# Altium footprint library PcbLib.PcbLib: 68 footprints (part 4 of 5)
Each footprint in its own frame and in the unit in brackets; x right, y up, seen from the top. Pads: shape width x height; smd on the part's side, far side on the other; paste and mask are expansions set on the pad; w line width, h text height; cw(c..) or ccw(c..) is an arc to the next point about the centre after c.
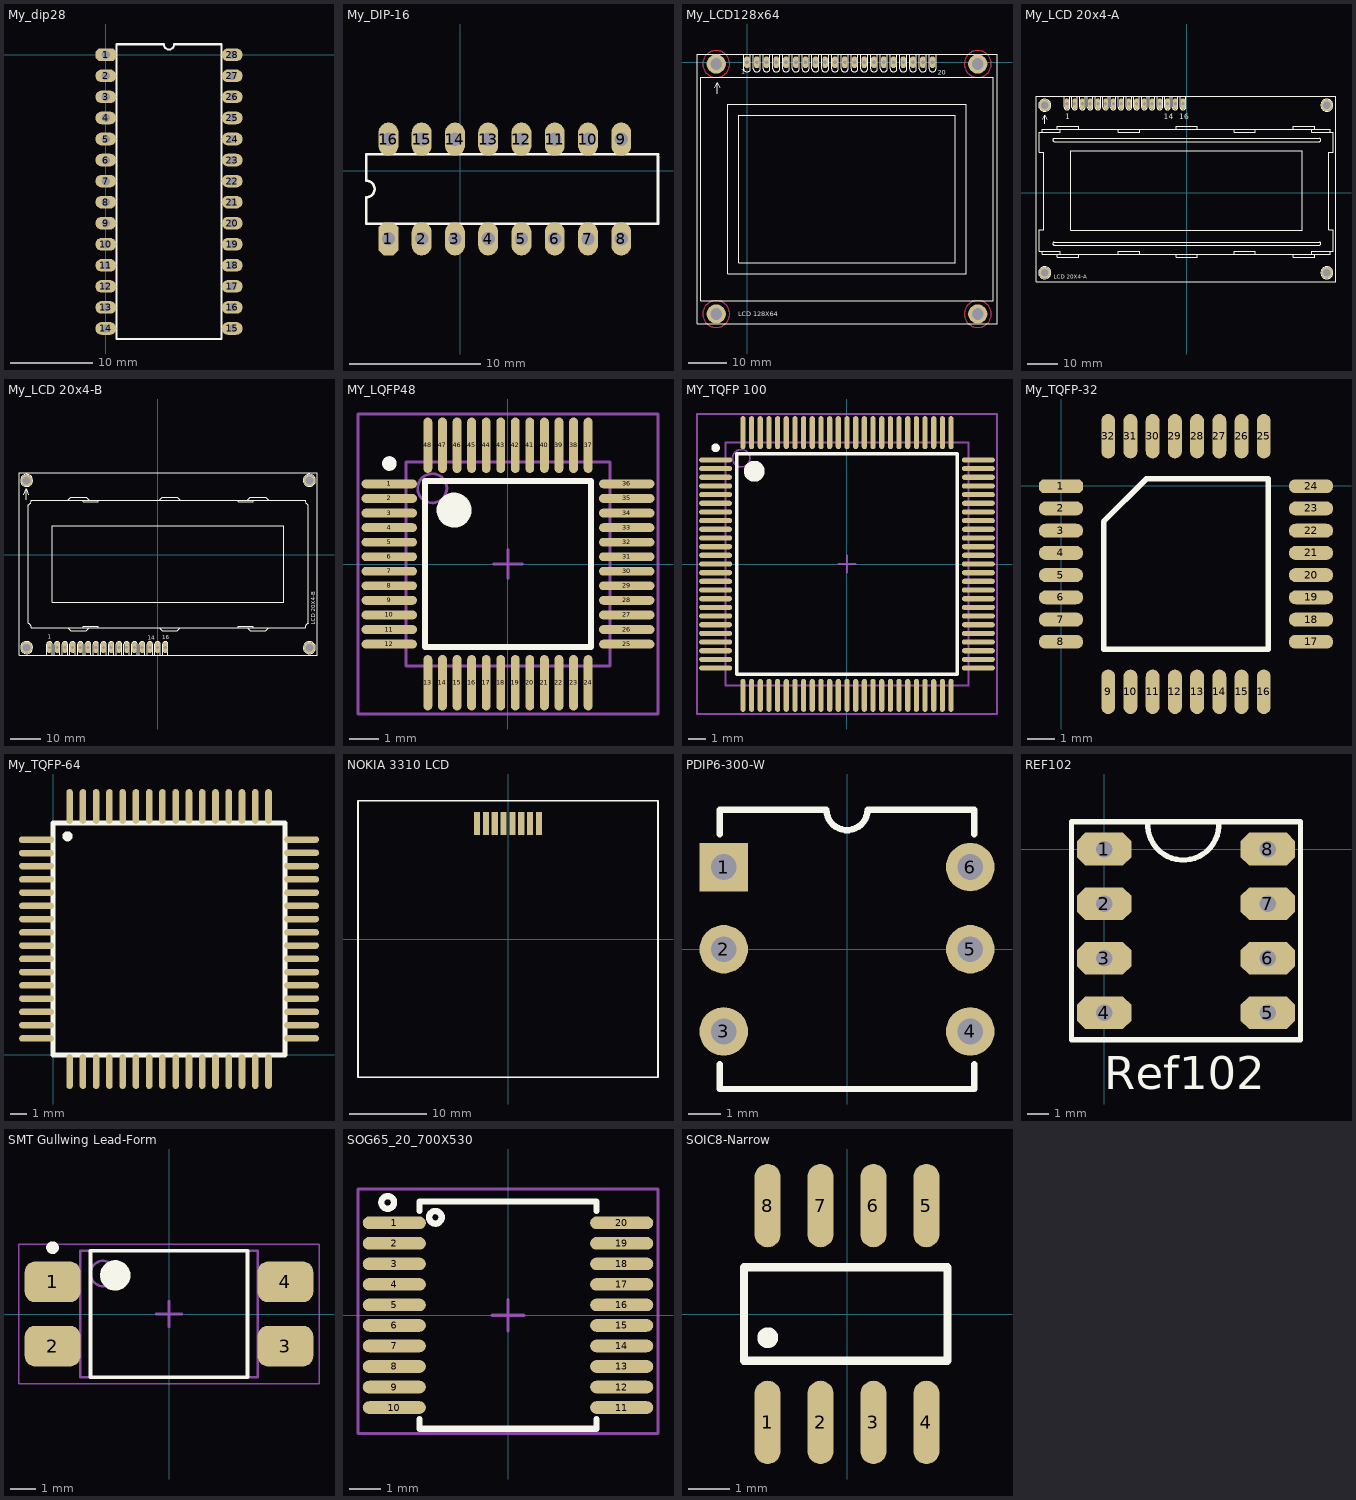
[diagram p3: the footprints below, top view; thin cyan lines are the x and y axes]

## My_dip28 [mil]
pads (28):
  oct 100x60 hole 40: 1(-0.5,-0.5)
  oval 100x60 hole 40: 2(-0.5,-100.5) 3(-0.5,-200.5) 4(-0.5,-300.5) 5(-0.5,-400.5) 6(-0.5,-500.5) 7(-0.5,-600.5) 8(-0.5,-700.5) 9(-0.5,-800.5) 10(-0.5,-900.5) 11(-0.5,-1000.5) 12(-0.5,-1100.5) 13(-0.5,-1200.5) 14(-0.5,-1300.5) 15(599.5,-1300.5) 16(599.5,-1200.5) 17(599.5,-1100.5) 18(599.5,-1000.5) 19(599.5,-900.5) 20(599.5,-800.5) 21(599.5,-700.5) 22(599.5,-600.5) 23(599.5,-500.5) 24(599.5,-400.5) 25(599.5,-300.5) 26(599.5,-200.5) 27(599.5,-100.5) 28(599.5,-0.5)
Top Overlay:
  lines w10: 49.5,-1350.5 49.5,49.5 274.5,49.5 ccw(c299.5,49.5) 324.5,49.5 549.5,49.5 549.5,-1350.5 49.5,-1350.5

## My_DIP-16 [mil]
height 20
pads (16):
  oct 60x100 hole 40: 1(-215.5,-205.5)
  oval 60x100 hole 40: 2(-115.5,-205.5) 3(-15.5,-205.5) 4(84.5,-205.5) 5(184.5,-205.5) 6(284.5,-205.5) 7(384.5,-205.5) 8(484.5,-205.5) 9(484.5,94.5) 10(384.5,94.5) 11(284.5,94.5) 12(184.5,94.5) 13(84.5,94.5) 14(-15.5,94.5) 15(-115.5,94.5) 16(-215.5,94.5)
Top Overlay:
  lines w7.87: -282.04,-160 595,-160 595,43.83 ; -282.04,-159.83 -282.04,-80.5 ccw(c-282.04,-55.5) -282.04,-30.5 -282.04,48.83 595,48.83

## My_LCD128x64 [mm]
pads (24):
  oct 1.508x3.016 hole 1: 1(0,0) 2(2.54,0) 3(5.08,0) 4(7.62,0) 5(10.16,0) 6(12.7,0) 7(15.24,0) 8(17.78,0) 9(20.32,0) 10(22.86,0) 11(25.4,0) 12(27.94,0) 13(30.48,0) 14(33.02,0) 15(35.56,0) 16(38.1,0) 17(40.64,0) 18(43.18,0) 19(45.72,0) 20(48.26,0)
  round 5 hole 3 unplated: ""(-8,-65.46) ""(-8,-0.46) ""(60,-65.46) ""(60,-0.46)
Top Layer:
  circle w0.203: c60,-65.46 r3.502
  circle w0.203: c-8,-65.46 r3.5
  circle w0.203: c60,-0.46 r3.5
  circle w0.203: c-8,-0.46 r3.502
Bottom Layer:
  circle w0.203: c-8,-65.46 r3.505
  circle w0.203: c60,-65.46 r3.502
  circle w0.203: c60,-0.46 r3.502
  circle w0.203: c-8,-0.46 r3.501
Top Overlay:
  lines w0.127: -8.382,-6.604 -7.747,-5.334 -7.112,-6.604 ; -7.747,-8.146 -7.747,-5.461 ; -0.889,1.905 -0.889,-1.651 ccw(c0,-1.651) 0.889,-1.651 0.889,1.905 ; 1.651,1.905 1.651,-1.651 ccw(c2.54,-1.651) 3.429,-1.651 3.429,1.905 ; 4.191,1.905 4.191,-1.651 ccw(c5.08,-1.651) 5.969,-1.651 5.969,1.905 ; 6.731,1.905 6.731,-1.651 ccw(c7.62,-1.651) 8.509,-1.651 8.509,1.905 ; 9.271,1.905 9.271,-1.651 ccw(c10.16,-1.651) 11.049,-1.651 11.049,1.905 ; 11.811,1.905 11.811,-1.651 ccw(c12.7,-1.651) 13.589,-1.651 13.589,1.905 ; 14.351,1.905 14.351,-1.651 ccw(c15.24,-1.651) 16.129,-1.651 16.129,1.905 ; 16.891,1.905 16.891,-1.651 ccw(c17.78,-1.651) 18.669,-1.651 18.669,1.905 ; 19.431,1.905 19.431,-1.651 ccw(c20.32,-1.651) 21.209,-1.651 21.209,1.905 ; 21.971,1.905 21.971,-1.651 ccw(c22.86,-1.651) 23.749,-1.651 23.749,1.905 ; 24.511,1.905 24.511,-1.651 ccw(c25.4,-1.651) 26.289,-1.651 26.289,1.905 ; 27.051,1.905 27.051,-1.651 ccw(c27.94,-1.651) 28.829,-1.651 28.829,1.905 ; 29.591,1.905 29.591,-1.651 ccw(c30.48,-1.651) 31.369,-1.651 31.369,1.905 ; 32.131,1.905 32.131,-1.651 ccw(c33.02,-1.651) 33.909,-1.651 33.909,1.905 ; 34.671,1.905 34.671,-1.651 ccw(c35.56,-1.651) 36.449,-1.651 36.449,1.905 ; 37.211,1.905 37.211,-1.651 ccw(c38.1,-1.651) 38.989,-1.651 38.989,1.905 ; 39.751,1.905 39.751,-1.651 ccw(c40.64,-1.651) 41.529,-1.651 41.529,1.905 ; 42.291,1.905 42.291,-1.651 ccw(c43.18,-1.651) 44.069,-1.651 44.069,1.905 ; 44.831,1.905 44.831,-1.651 ccw(c45.72,-1.651) 46.609,-1.651 46.609,1.905 ; 47.371,1.905 47.371,-1.651 ccw(c48.26,-1.651) 49.149,-1.651 49.149,1.905
  lines w0.203: -13,-67.96 65,-67.96 65,2.04 -13,2.04 -13,-67.96 ; -12,-61.96 64,-61.96 64,-3.96 -12,-3.96 -12,-61.96 ; -5,-54.96 57,-54.96 57,-10.96 -5,-10.96 -5,-54.96 ; -2.13,-52.14 54.14,-52.14 54.14,-13.79 -2.13,-13.79 -2.13,-52.14
  text "LCD 128X64" at -2.286,-66.04 h1.27
  text "1" at -1.524,-3.048 h1.27
  text "20" at 49.53,-3.302 h1.27

## My_LCD 20x4-A [mil]
pads (20):
  oct 60x140 hole 40: 1(-1550.5,1150) 2(-1450.5,1150) 3(-1350.5,1150) 4(-1250.5,1150) 5(-1150.5,1150) 6(-1050.5,1150) 7(-950.5,1150) 8(-850.5,1150) 9(-750.5,1150) 10(-650.5,1150) 11(-550.5,1150) 12(-450.5,1150) 13(-350.5,1150) 14(-250.5,1150) 15(-150.5,1150) 16(-50.5,1150)
  round 150 hole 100: P$1(-1837.5,-1035) P$2(1808.5,-1035) P$3(1808.5,1130.5) P$4(-1837.5,1130)
Top Overlay:
  drawing of 163 lines, arcs and shapes, not listed
  text "1" at -1575,950 h70
  text "16" at -100,950 h70
  text "14" at -300,950 h70
  text "LCD 20X4-A" at -1719.69,-1112.2 h50

## My_LCD 20x4-B [mil]
pads (20):
  oct 60x140 hole 40: 1(-1400.5,-1199) 2(-1300.5,-1199) 3(-1200.5,-1199) 4(-1100.5,-1199) 5(-1000.5,-1199) 6(-900.5,-1199) 7(-800.5,-1199) 8(-700.5,-1199) 9(-600.5,-1199) 10(-500.5,-1199) 11(-400.5,-1199) 12(-300.5,-1199) 13(-200.5,-1199) 14(-100.5,-1199) 15(-0.5,-1199) 16(99.5,-1199)
  round 150 hole 100: P$1(-1695.5,965.5) P$2(-1695.5,-1199.5) P$3(1966,-1200) P$4(1966,965.5)
Top Overlay:
  circle w5: c-1695.5,965.5 r78
  circle w5: c1966,965.5 r78
  circle w5: c1966,-1199.5 r78
  circle w5: c-1695.5,-1199.5 r78
  lines w5: -1734.95,-1199.6 -1656.21,-1199.6 ; -1734.95,965.8 -1656.21,965.8 ; -1730,778.7 -1700,859 -1675,778.7 ; -1700,716.5 -1700,844 ; -1695.58,-1239 -1695.58,-1160.2 ; -1695.58,926.4 -1695.58,1005.1 ; -1673.23,-885.9 -1673.23,649.6 ; -1673.23,-885.83 cw(c-1692.91,-941.6) -1633.86,-944.88 -1161.42,-944.9 ; -1673.23,649.53 ccw(c-1692.91,705.3) -1633.86,708.58 -1161.42,708.6 ; -1435,-1295 -1435,-1155 cw(c-1400,-1157.5) -1365,-1160 -1365,-1295 ; -1335,-1295 -1335,-1155 cw(c-1300,-1157.5) -1265,-1160 -1265,-1295 ; -1235,-1295 -1235,-1155 cw(c-1200,-1157.5) -1165,-1160 -1165,-1295 ; -1135,-1295 -1135,-1155 cw(c-1100,-1157.5) -1065,-1160 -1065,-1295 ; -1035,-1295 -1035,-1155 cw(c-1000,-1157.5) -965,-1160 -965,-1295 ; -935,-1295 -935,-1155 cw(c-900,-1157.5) -865,-1160 -865,-1295 ; -835,-1295 -835,-1155 cw(c-800,-1157.5) -765,-1160 -765,-1295 ; -735,-1295 -735,-1155 cw(c-700,-1157.5) -665,-1160 -665,-1295 ; -635,-1295 -635,-1155 cw(c-600,-1157.5) -565,-1160 -565,-1295 ; -535,-1295 -535,-1155 cw(c-500,-1157.5) -465,-1160 -465,-1295 ; -435,-1295 -435,-1155 cw(c-400,-1157.5) -365,-1160 -365,-1295 ; -335,-1295 -335,-1155 cw(c-300,-1157.5) -265,-1160 -265,-1295 ; -235,-1295 -235,-1155 cw(c-200,-1157.5) -165,-1160 -165,-1295 ; -135,-1295 -135,-1155 cw(c-100,-1157.5) -65,-1160 -65,-1295 ; -35,-1295 -35,-1155 cw(c0,-1157.5) 35,-1160 35,-1295 ; 65,-1295 65,-1155 cw(c100,-1157.5) 135,-1160 135,-1295 ; 1631.19,316.1 1631.19,375.2 ; 1926.47,-1199.6 2005.21,-1199.6 ; 1926.47,965.8 2005.21,965.8 ; 1948.82,-885.9 1948.82,649.6 ; 1948.82,-885.83 ccw(c1968.5,-941.6) 1909.45,-944.88 1437.01,-944.9 ; 1948.82,649.53 cw(c1968.5,705.3) 1909.45,708.58 1437.01,708.6 ; 1965.84,-1239 1965.84,-1160.2 ; 1965.84,926.4 1965.84,1005.1 ; -1161.42,-944.9 -1122.05,-984.3 -925.2,-984.3 -885.83,-944.9 ; -1161.42,-944.9 -964.57,-944.9 ; -1161.42,708.6 -1122.05,748 -925.2,748 -885.83,708.6 ; -1161.42,708.6 -964.57,708.6 ; -964.57,-944.9 -964.57,-925.2 -767.72,-925.2 -767.72,-944.9 ; -964.57,-944.9 -885.83,-944.9 ; -964.57,708.6 -964.57,688.9 -767.72,688.9 -767.72,708.6 ; -964.57,708.6 -885.83,708.6 ; -885.83,-944.9 -767.72,-944.9 ; -885.83,708.6 -767.72,708.6 ; -767.72,-944.9 19.68,-944.9 ; -767.72,708.6 19.68,708.6 ; 19.68,-944.9 59.05,-984.3 255.9,-984.3 295.27,-944.9 ; 19.68,-944.9 295.27,-944.9 ; 19.68,708.6 59.05,748 255.9,748 295.27,708.6 ; 19.68,708.6 295.27,708.6 ; 295.27,-944.9 1043.31,-944.9 ; 295.27,708.6 1043.31,708.6 ; 1043.31,-944.9 1043.31,-925.2 1240.16,-925.2 1240.16,-944.9 ; 1043.31,-944.9 1161.42,-944.9 ; 1043.31,708.6 1043.31,688.9 1240.16,688.9 1240.16,708.6 ; 1043.31,708.6 1161.42,708.6 ; 1161.42,-944.9 1200.79,-984.3 1397.64,-984.3 1437.01,-944.9 ; 1161.42,-944.9 1240.16,-944.9 ; 1161.42,708.6 1200.79,748 1397.64,748 1437.01,708.6 ; 1161.42,708.6 1240.16,708.6 ; 1240.16,-944.9 1437.01,-944.9 ; 1240.16,708.6 1437.01,708.6 ; 1631.19,375.2 1631.19,-609.1 -1360.93,-609.1 -1360.93,375.2 1631.19,375.2 ; -1794,-1298 -1794,1064.2 2064.27,1064.2 2064.27,-1298 -1794,-1298
  text "LCD 20X4-B" at 2040.16,-903.2 h50
  text "16" at 60,-1094 h50
  text "1" at -1420,-1084 h50
  text "14" at -130,-1100 h50

## MY_LQFP48 [mm] "TSQFP, 48-Leads, Body 9.0x9.0mm (max), Pitch 0.50mm, IPC Medium Density"
height 1.6
pads (48):
  oval 1.905x0.3 smd: 1(-4.075,2.75) 2(-4.075,2.25) 3(-4.075,1.75) 4(-4.075,1.25) 5(-4.075,0.75) 6(-4.075,0.25) 7(-4.075,-0.25) 8(-4.075,-0.75) 9(-4.075,-1.25) 10(-4.075,-1.75) 11(-4.075,-2.25) 12(-4.075,-2.75) 25(4.075,-2.75) 26(4.075,-2.25) 27(4.075,-1.75) 28(4.075,-1.25) 29(4.075,-0.75) 30(4.075,-0.25) 31(4.075,0.25) 32(4.075,0.75) 33(4.075,1.25) 34(4.075,1.75) 35(4.075,2.25) 36(4.075,2.75)
  oval 0.3x1.905 smd: 13(-2.75,-4.075) 14(-2.25,-4.075) 15(-1.75,-4.075) 16(-1.25,-4.075) 17(-0.75,-4.075) 18(-0.25,-4.075) 19(0.25,-4.075) 20(0.75,-4.075) 21(1.25,-4.075) 22(1.75,-4.075) 23(2.25,-4.075) 24(2.75,-4.075) 37(2.75,4.075) 38(2.25,4.075) 39(1.75,4.075) 40(1.25,4.075) 41(0.75,4.075) 42(0.25,4.075) 43(-0.25,4.075) 44(-0.75,4.075) 45(-1.25,4.075) 46(-1.75,4.075) 47(-2.25,4.075) 48(-2.75,4.075)
Top Overlay:
  circle w0.25: c-4.075,3.45 r0.125
  circle w0.6: c-1.85,1.85 r0.3
  lines w0.2: -2.85,-2.85 -2.85,2.85 2.85,2.85 2.85,-2.85 -2.85,-2.85
Mechanical 13:
  circle w0.1: c-2.6,2.6 r0.5
  lines w0.1: -3.5,-3.5 -3.5,3.5 3.5,3.5 3.5,-3.5 -3.5,-3.5
Mechanical 15:
  lines w0.1: -0.5,0 0.5,0 ; 0,-0.5 0,0.5 ; -5.15,-5.15 -5.15,5.15 5.15,5.15 5.15,-5.15 -5.15,-5.15
3D body: height 1.6, standoff 0.05, extent -3.5,-3.5 3.5,3.5

## MY_TQFP 100 [mm] "TSQFP, 100-Leads, Body 16.0x16.0mm (max), Pitch 0.50mm, IPC Medium Density"
height 1.6
pads (100):
  oval 1.905x0.3 smd: 1(-7.575,6) 2(-7.575,5.5) 3(-7.575,5) 4(-7.575,4.5) 5(-7.575,4) 6(-7.575,3.5) 7(-7.575,3) 8(-7.575,2.5) 9(-7.575,2) 10(-7.575,1.5) 11(-7.575,1) 12(-7.575,0.5) 13(-7.575,0) 14(-7.575,-0.5) 15(-7.575,-1) 16(-7.575,-1.5) 17(-7.575,-2) 18(-7.575,-2.5) 19(-7.575,-3) 20(-7.575,-3.5) 21(-7.575,-4) 22(-7.575,-4.5) 23(-7.575,-5) 24(-7.575,-5.5) 25(-7.575,-6) 51(7.575,-6) 52(7.575,-5.5) 53(7.575,-5) 54(7.575,-4.5) 55(7.575,-4) 56(7.575,-3.5) 57(7.575,-3) 58(7.575,-2.5) 59(7.575,-2) 60(7.575,-1.5) 61(7.575,-1) 62(7.575,-0.5) 63(7.575,0) 64(7.575,0.5) 65(7.575,1) 66(7.575,1.5) 67(7.575,2) 68(7.575,2.5) 69(7.575,3) 70(7.575,3.5) 71(7.575,4) 72(7.575,4.5) 73(7.575,5) 74(7.575,5.5) 75(7.575,6)
  oval 0.3x1.905 smd: 26(-6,-7.575) 27(-5.5,-7.575) 28(-5,-7.575) 29(-4.5,-7.575) 30(-4,-7.575) 31(-3.5,-7.575) 32(-3,-7.575) 33(-2.5,-7.575) 34(-2,-7.575) 35(-1.5,-7.575) 36(-1,-7.575) 37(-0.5,-7.575) 38(0,-7.575) 39(0.5,-7.575) 40(1,-7.575) 41(1.5,-7.575) 42(2,-7.575) 43(2.5,-7.575) 44(3,-7.575) 45(3.5,-7.575) 46(4,-7.575) 47(4.5,-7.575) 48(5,-7.575) 49(5.5,-7.575) 50(6,-7.575) 76(6,7.575) 77(5.5,7.575) 78(5,7.575) 79(4.5,7.575) 80(4,7.575) 81(3.5,7.575) 82(3,7.575) 83(2.5,7.575) 84(2,7.575) 85(1.5,7.575) 86(1,7.575) 87(0.5,7.575) 88(0,7.575) 89(-0.5,7.575) 90(-1,7.575) 91(-1.5,7.575) 92(-2,7.575) 93(-2.5,7.575) 94(-3,7.575) 95(-3.5,7.575) 96(-4,7.575) 97(-4.5,7.575) 98(-5,7.575) 99(-5.5,7.575) 100(-6,7.575)
Top Overlay:
  circle w0.25: c-7.575,6.7 r0.125
  circle w0.6: c-5.35,5.35 r0.3
  lines w0.2: -6.35,-6.35 -6.35,6.35 6.35,6.35 6.35,-6.35 -6.35,-6.35
Mechanical 13:
  circle w0.1: c-6.1,6.1 r0.5
  lines w0.1: -7,-7 -7,7 7,7 7,-7 -7,-7
Mechanical 15:
  lines w0.1: -0.5,0 0.5,0 ; 0,-0.5 0,0.5 ; -8.65,-8.65 -8.65,8.65 8.65,8.65 8.65,-8.65 -8.65,-8.65
3D body: height 1.6, standoff 0.05, extent -7,-7 7,7

## My_TQFP-32 [mm]
pads (32):
  oct 1.6x0.5 smd: 1(-0.013,-0.019)
  oval 1.6x0.5 smd: 2(-0.013,-0.819) 3(-0.013,-1.619) 4(-0.013,-2.419) 5(-0.013,-3.219) 6(-0.013,-4.019) 7(-0.013,-4.819) 8(-0.013,-5.619) 17(8.987,-5.619) 18(8.987,-4.819) 19(8.987,-4.019) 20(8.987,-3.219) 21(8.987,-2.419) 22(8.987,-1.619) 23(8.987,-0.819) 24(8.987,-0.019)
  oval 0.5x1.6 smd: 9(1.687,-7.419) 10(2.487,-7.419) 11(3.287,-7.419) 12(4.087,-7.419) 13(4.887,-7.419) 14(5.687,-7.419) 15(6.487,-7.419) 16(7.287,-7.419) 25(7.287,1.781) 26(6.487,1.781) 27(5.687,1.781) 28(4.887,1.781) 29(4.087,1.781) 30(3.287,1.781) 31(2.487,1.781) 32(1.687,1.781)
Top Overlay:
  lines w0.2: 1.522,-5.884 7.452,-5.884 7.452,0.246 3.057,0.246 1.522,-1.289 1.522,-5.884

## My_TQFP-64 [mm]
pads (64):
  oct 2.1x0.4 smd: 1(-1.022,12.997)
  oval 2.1x0.4 smd: 2(-1.029,12.179) 3(-1.022,11.397) 4(-1.022,10.597) 5(-1.022,9.797) 6(-1.022,8.997) 7(-1.022,8.197) 8(-1.022,7.397) 9(-1.022,6.597) 10(-1.022,5.797) 11(-1.022,4.997) 12(-1.022,4.197) 13(-1.022,3.397) 14(-1.022,2.597) 15(-1.022,1.797) 16(-1.022,0.997) 33(14.978,0.997) 34(14.978,1.797) 35(14.978,2.597) 36(14.978,3.397) 37(14.978,4.197) 38(14.978,4.997) 39(14.978,5.797) 40(14.978,6.597) 41(14.978,7.397) 42(14.978,8.197) 43(14.978,8.997) 44(14.978,9.797) 45(14.978,10.597) 46(14.978,11.397) 47(14.978,12.197) 48(14.978,12.997)
  oval 0.4x2.1 smd: 17(0.978,-1.003) 18(1.778,-1.003) 19(2.578,-1.003) 20(3.378,-1.003) 21(4.178,-1.003) 22(4.978,-1.003) 23(5.778,-1.003) 24(6.578,-1.003) 25(7.378,-1.003) 26(8.178,-1.003) 27(8.978,-1.003) 28(9.778,-1.003) 29(10.578,-1.003) 30(11.378,-1.003) 31(12.178,-1.003) 32(12.978,-1.003) 49(12.978,14.997) 50(12.178,14.997) 51(11.378,14.997) 52(10.578,14.997) 53(9.778,14.997) 54(8.978,14.997) 55(8.178,14.997) 56(7.378,14.997) 57(6.578,14.997) 58(5.778,14.997) 59(4.978,14.997) 60(4.178,14.997) 61(3.378,14.997) 62(2.578,14.997) 63(1.778,14.997) 64(0.978,14.997)
Top Overlay:
  circle w0.305: c0.851,13.195 r0.152
  lines w0.305: -0.022,-0.003 -0.022,13.997 13.978,13.997 13.978,-0.003 -0.022,-0.003

## NOKIA 3310 LCD [mm] "NOKIA 3310 LCD"
height 3
pads (8):
  rect 0.8x3 smd: 1(4.025,15) 2(2.875,15) 3(1.725,15) 4(0.575,15) 5(-0.575,15) 6(-1.725,15) 7(-2.875,15) 8(-4.025,15)
Top Overlay:
  lines w0.2: -19.5,-18 -19.5,18 19.5,18 19.5,-18 -19.5,-18
3D body "NOKIA 3310.STEP": height 2.06, standoff 0.04, extent -19.25,-17.75 19.25,17.75

## PCBComponent_1 [mm]

## PDIP6-300-W [mm] "PDIP6-300 White"
height 6
pads (6):
  rect 1.5x1.5 hole 0.8: 1(-3.81,2.54)
  round 1.5 hole 0.8: 2(-3.81,0) 3(-3.81,-2.54) 4(3.81,-2.54) 5(3.81,0) 6(3.81,2.54)
Top Overlay:
  lines w0.2: -3.937,-3.556 -3.937,-4.318 3.937,-4.318 3.937,-3.556 ; -3.935,3.558 -3.935,4.318 -0.696,4.318 ; -0.635,4.318 ccw(c0,4.318) 0.635,4.318 ; 0.696,4.318 3.937,4.318 3.937,3.556
3D body "DIL6-300-W.STEP": height 3.86, standoff -3.25, extent -3.935,-4.25 3.935,4.25

## REF102 [mil] "Precision voltage reference IC"
pads (8):
  oct 99.37x60 hole 30: 1(0,0) 2(0,-100) 3(0,-200) 4(0,-300) 5(300,-300) 6(300,-200) 7(300,-100) 8(300,0)
Top Overlay:
  lines w10: 80,50 ccw(c145,45) 210,50 ; -60,-350 -60,50 360,50 360,-350 -60,-350
  text "Ref102" at 0,-440 h60

## SMT Gullwing Lead-Form [mm] "SOP, 4-Leads, Body 4/65x6/75mm, Pitch 2/54mm, IPC Medium Density designer:abbas basereh"
height 3.5
pads (4):
  rrect50% 2.2x1.6 smd mask+0.06: 1(-4.6,1.27) 2(-4.6,-1.27) 3(4.6,-1.27) 4(4.6,1.27)
Top Overlay:
  circle w0.6: c-2.125,1.525 r0.3
  circle w0.25: c-4.6,2.62 r0.125
  lines w0.15: -3.1,-2.5 3.1,-2.5 3.1,2.5 -3.1,2.5 -3.1,-2.5
Mechanical 13:
  circle w0.1: c-2.6,1.6 r0.5
  lines w0.1: -3.5,-2.5 3.5,-2.5 3.5,2.5 -3.5,2.5 -3.5,-2.5
Mechanical 15:
  lines w0.05: -5.925,-2.75 5.925,-2.75 5.925,2.75 -5.925,2.75 -5.925,-2.75
  lines w0.1: -0.5,0 0.5,0 ; 0,-0.5 0,0.5
3D body "User Library-PC817_Gullwing.STEP": height 3.89, standoff 0.04, extent -5,-2.29 5,2.29

## SOG65_20_700X530 [mm]
height 7.62
pads (20):
  oval 2x0.4 smd mask+0.075: 1(-3.6,2.925) 2(-3.6,2.275) 3(-3.6,1.625) 4(-3.6,0.975) 5(-3.6,0.325) 6(-3.6,-0.325) 7(-3.6,-0.975) 8(-3.6,-1.625) 9(-3.6,-2.275) 10(-3.6,-2.925) 11(3.6,-2.925) 12(3.6,-2.275) 13(3.6,-1.625) 14(3.6,-0.975) 15(3.6,-0.325) 16(3.6,0.325) 17(3.6,0.975) 18(3.6,1.625) 19(3.6,2.275) 20(3.6,2.925)
Top Overlay:
  circle w0.2: c-3.81,3.57 r0.2
  circle w0.2: c-2.3,3.1 r0.2
  lines w0.2: -2.8,-3.3 -2.8,-3.6 2.8,-3.6 2.8,-3.3 ; -2.8,3.3 -2.8,3.6 2.8,3.6 2.8,3.3
Mechanical 15:
  lines w0.1: -0.5,0 0.5,0 ; 0,-0.5 0,0.5 ; -4.75,-3.75 4.75,-3.75 4.75,4 -4.75,4 -4.75,-3.75
3D body "User Library-SSOP 20 PIN-1.step": height 1.98, standoff -0.01, extent -3.95,-3.665 3.95,3.665

## SOIC8-Narrow [mm] "SOIC, 8-Leads, Body 3.0x3.0mm (max), Pitch 1.27mm, IPC Medium Density"
height 1.11
pads (8):
  oval 0.625x2 smd: 1(-1.905,-2.6) 2(-0.635,-2.6) 3(0.635,-2.6) 4(1.905,-2.6) 5(1.905,2.6) 6(0.635,2.6) 7(-0.635,2.6) 8(-1.905,2.6)
Top Overlay:
  circle w0.25: c-1.903,-0.568 r0.125
  lines w0.2: -2.47,-1.125 2.413,-1.125 2.413,1.125 -2.47,1.125 -2.47,-1.125
3D body "SO8_narrow.step": height 1.7, standoff 0, extent -2.413,-3.099 2.413,3.099